# Altium footprint library XU-GENARAL PCB .PcbLib: 1176 footprints (part 36 of 75)
Each footprint in its own frame and in the unit in brackets; x right, y up, seen from the top. Pads: shape width x height; smd on the part's side, far side on the other; paste and mask are expansions set on the pad; w line width, h text height; cw(c..) or ccw(c..) is an arc to the next point about the centre after c.
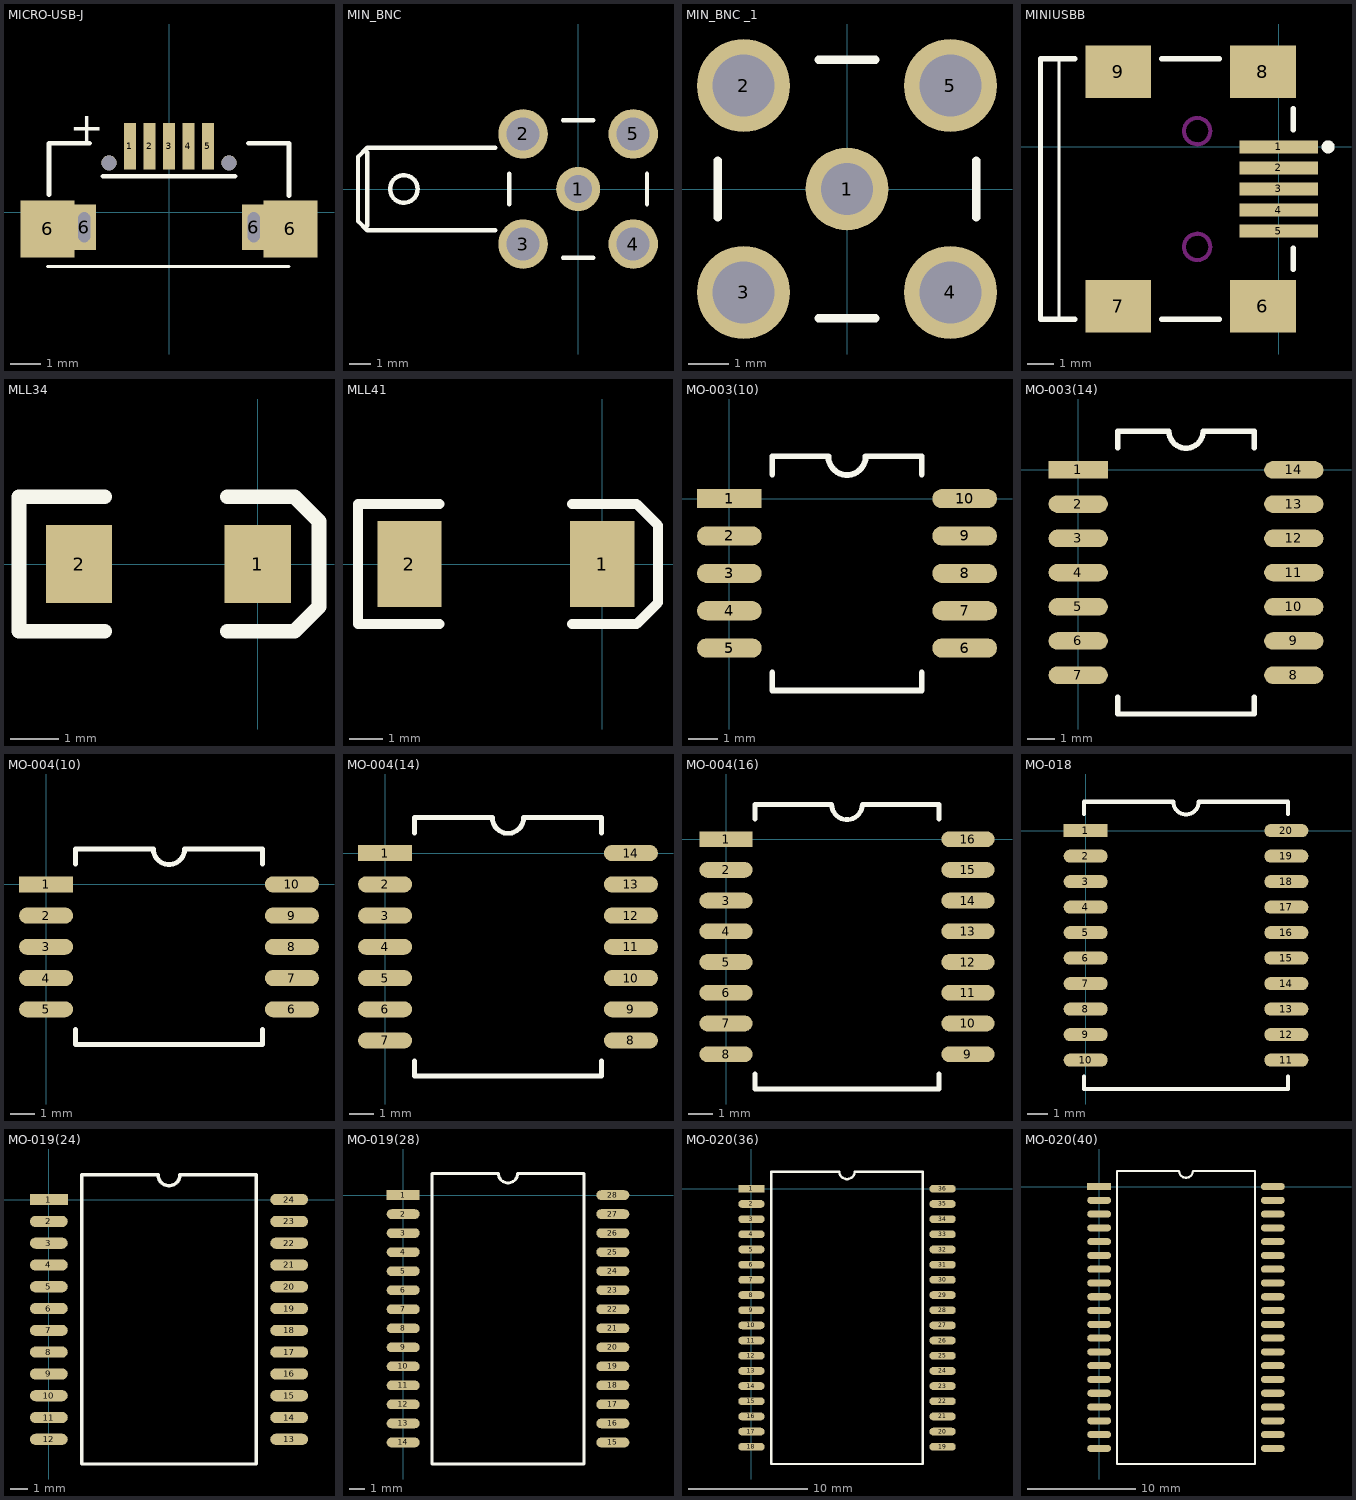
[diagram p35: the footprints below, top view; thin cyan lines are the x and y axes]

## MICRO-USB-J [mm]
pads (11):
  rect 0.4x1.55 smd: 1(-1.3,2.2) 2(-0.65,2.2) 3(0,2.2) 4(0.65,2.2) 5(1.3,2.2)
  rect 1.8x1.9 smd: 6(-4.05,-0.55) 6(4.05,-0.55)
  rect 0.8x1.5 hole 0.4 slot 1 at 90 deg: 6(-2.825,-0.5) 6(2.825,-0.5)
  round 0.5 hole 0.5 unplated: ""(-2,1.65) ""(2,1.65)
Top Overlay:
  lines w0.1: -4.05,-1.8 4,-1.8
  lines w0.152: -4,0.584 -4,2.3 -2.65,2.3 ; -2.2,1.2 2.2,1.2 ; 2.65,2.3 4,2.3 4,0.55
  text "+" at -3.3,2.35 h1
Keep-Out Layer:
  lines w0.127: -3.054,-1.043 -2.596,-1.043 -2.596,0.075 -3.054,0.075 -3.054,-1.043 ; 2.596,-1.043 3.054,-1.043 3.054,0.075 2.596,0.075 2.596,-1.043
Mechanical 1:
  lines w0.127: -3.054,-1.043 -3.054,0.075 -2.596,0.075 -2.596,-1.043 -3.054,-1.043 ; 2.596,-1.043 2.596,0.075 3.054,0.075 3.054,-1.043 2.596,-1.043

## MIN_BNC [mil]
height 43.31
pads (5):
  round 80 hole 50: 1(0,0)
  round 90 hole 60: 2(-100,100) 3(-100,-100) 4(100,-100) 5(100,100)
Top Overlay:
  circle w8: c-316.67,0 r25
  lines w8: -383.33,-66.67 -383.33,66.67 ; -150.63,-75 -383.33,-75 -400,-58.33 -400,58.33 -383.33,75 -150.63,75 ; -125,-27.56 -125,27.56 ; -27.56,-125 27.56,-125 ; -27.56,125 27.56,125 ; 125,-27.56 125,27.56

## MIN_BNC _1 [mil]
height 43.31
pads (5):
  round 80 hole 50: 1(0,0)
  round 90 hole 60: 2(-100,100) 3(-100,-100) 4(100,-100) 5(100,100)
Top Overlay:
  lines w8: -125,-27.56 -125,27.56 ; -27.56,-125 27.56,-125 ; -27.56,125 27.56,125 ; 125,-27.56 125,27.56

## MINIUSBB [mm]
pads (9):
  rect 3x0.5 smd: 1(0,0) 2(0,-0.8) 3(0,-1.6) 4(0,-2.4) 5(0,-3.2)
  rect 2.5x2 smd: 6(-0.6,-6.05) 7(-6.1,-6.05) 8(-0.6,2.85) 9(-6.1,2.85)
Top Overlay:
  circle w0.25: c1.875,0 r0.125
  lines w0.1: -8.35,-6.55 -8.35,3.35
  lines w0.2: -7.75,-6.55 -9.05,-6.55 -9.05,3.35 -7.75,3.35 ; -4.45,-6.55 -2.25,-6.55 ; -4.45,3.35 -2.25,3.35 ; 0.55,-4.65 0.55,-3.85 ; 0.55,0.65 0.55,1.45
Keep-Out Layer:
  circle w0.152: c-3.1,-3.8 r0.5
  circle w0.152: c-3.1,0.6 r0.5

## MLL34 [mil]
pads (2):
  rect 54x64 smd: 1(0,0) 2(-146,0)
Top Overlay:
  lines w12: -125,-55 -195,-55 -195,55 -125,55 ; -25,-55 30,-55 50,-35 50,35 30,55 -25,55

## MLL41 [mil]
pads (2):
  rect 75x100 smd: 1(0,0) 2(-225,0)
Top Overlay:
  lines w12: -190,-70 -285,-70 -285,70 -190,70 ; -35,-70 40,-70 65,-45 65,45 40,70 -35,70

## MO-003(10) [mm]
pads (10):
  rect 2.2x0.65 smd: 1(0,0)
  oval 2.2x0.65 smd: 2(0,-1.27) 3(0,-2.54) 4(0,-3.81) 5(0,-5.08) 6(8,-5.08) 7(8,-3.81) 8(8,-2.54) 9(8,-1.27) 10(8,0)
Top Overlay:
  lines w0.2: 1.46,-5.905 1.46,-6.52 6.54,-6.52 6.54,-5.905 ; 1.46,0.825 1.46,1.44 3.365,1.44 ccw(c4,1.44) 4.635,1.44 6.54,1.44 6.54,0.825

## MO-003(14) [mm]
pads (14):
  rect 2.2x0.65 smd: 1(0,0)
  oval 2.2x0.65 smd: 2(0,-1.27) 3(0,-2.54) 4(0,-3.81) 5(0,-5.08) 6(0,-6.35) 7(0,-7.62) 8(8,-7.62) 9(8,-6.35) 10(8,-5.08) 11(8,-3.81) 12(8,-2.54) 13(8,-1.27) 14(8,0)
Top Overlay:
  lines w0.2: 1.46,-8.445 1.46,-9.06 6.54,-9.06 6.54,-8.445 ; 1.46,0.825 1.46,1.44 3.365,1.44 ccw(c4,1.44) 4.635,1.44 6.54,1.44 6.54,0.825

## MO-004(10) [mm]
pads (10):
  rect 2.2x0.65 smd: 1(0,0)
  oval 2.2x0.65 smd: 2(0,-1.27) 3(0,-2.54) 4(0,-3.81) 5(0,-5.08) 6(10,-5.08) 7(10,-3.81) 8(10,-2.54) 9(10,-1.27) 10(10,0)
Top Overlay:
  lines w0.2: 1.19,-5.905 1.19,-6.52 8.81,-6.52 8.81,-5.905 ; 1.19,0.825 1.19,1.44 4.365,1.44 ccw(c5,1.44) 5.635,1.44 8.81,1.44 8.81,0.825

## MO-004(14) [mm]
pads (14):
  rect 2.2x0.65 smd: 1(0,0)
  oval 2.2x0.65 smd: 2(0,-1.27) 3(0,-2.54) 4(0,-3.81) 5(0,-5.08) 6(0,-6.35) 7(0,-7.62) 8(10,-7.62) 9(10,-6.35) 10(10,-5.08) 11(10,-3.81) 12(10,-2.54) 13(10,-1.27) 14(10,0)
Top Overlay:
  lines w0.2: 1.19,-8.445 1.19,-9.06 8.81,-9.06 8.81,-8.445 ; 1.19,0.825 1.19,1.44 4.365,1.44 ccw(c5,1.44) 5.635,1.44 8.81,1.44 8.81,0.825

## MO-004(16) [mm]
pads (16):
  rect 2.2x0.65 smd: 1(0,0)
  oval 2.2x0.65 smd: 2(0,-1.27) 3(0,-2.54) 4(0,-3.81) 5(0,-5.08) 6(0,-6.35) 7(0,-7.62) 8(0,-8.89) 9(10,-8.89) 10(10,-7.62) 11(10,-6.35) 12(10,-5.08) 13(10,-3.81) 14(10,-2.54) 15(10,-1.27) 16(10,0)
Top Overlay:
  lines w0.2: 1.19,-9.715 1.19,-10.33 8.81,-10.33 8.81,-9.715 ; 1.19,0.825 1.19,1.44 4.365,1.44 ccw(c5,1.44) 5.635,1.44 8.81,1.44 8.81,0.825

## MO-018 [mm]
pads (20):
  rect 2.2x0.65 smd: 1(0,0)
  oval 2.2x0.65 smd: 2(0,-1.27) 3(0,-2.54) 4(0,-3.81) 5(0,-5.08) 6(0,-6.35) 7(0,-7.62) 8(0,-8.89) 9(0,-10.16) 10(0,-11.43) 11(10,-11.43) 12(10,-10.16) 13(10,-8.89) 14(10,-7.62) 15(10,-6.35) 16(10,-5.08) 17(10,-3.81) 18(10,-2.54) 19(10,-1.27) 20(10,0)
Top Overlay:
  lines w0.2: -0.08,-12.255 -0.08,-12.87 10.08,-12.87 10.08,-12.255 ; -0.08,0.825 -0.08,1.44 4.365,1.44 ccw(c5,1.44) 5.635,1.44 10.08,1.44 10.08,0.825

## MO-019(24) [mm]
pads (24):
  rect 2.2x0.65 smd: 1(0,0)
  oval 2.2x0.65 smd: 2(0,-1.27) 3(0,-2.54) 4(0,-3.81) 5(0,-5.08) 6(0,-6.35) 7(0,-7.62) 8(0,-8.89) 9(0,-10.16) 10(0,-11.43) 11(0,-12.7) 12(0,-13.97) 13(14,-13.97) 14(14,-12.7) 15(14,-11.43) 16(14,-10.16) 17(14,-8.89) 18(14,-7.62) 19(14,-6.35) 20(14,-5.08) 21(14,-3.81) 22(14,-2.54) 23(14,-1.27) 24(14,0)
Top Overlay:
  lines w0.2: 1.92,-15.41 12.08,-15.41 12.08,-6.985 12.08,1.44 7.635,1.44 cw(c7,1.44) 6.365,1.44 1.92,1.44 1.92,-6.985 1.92,-15.41

## MO-019(28) [mm]
pads (28):
  rect 2.2x0.65 smd: 1(0,0)
  oval 2.2x0.65 smd: 2(0,-1.27) 3(0,-2.54) 4(0,-3.81) 5(0,-5.08) 6(0,-6.35) 7(0,-7.62) 8(0,-8.89) 9(0,-10.16) 10(0,-11.43) 11(0,-12.7) 12(0,-13.97) 13(0,-15.24) 14(0,-16.51) 15(14,-16.51) 16(14,-15.24) 17(14,-13.97) 18(14,-12.7) 19(14,-11.43) 20(14,-10.16) 21(14,-8.89) 22(14,-7.62) 23(14,-6.35) 24(14,-5.08) 25(14,-3.81) 26(14,-2.54) 27(14,-1.27) 28(14,0)
Top Overlay:
  lines w0.2: 1.92,-17.95 12.08,-17.95 12.08,-8.255 12.08,1.44 7.635,1.44 cw(c7,1.44) 6.365,1.44 1.92,1.44 1.92,-8.255 1.92,-17.95

## MO-020(36) [mm]
pads (36):
  rect 2.2x0.65 smd: 1(0,0)
  oval 2.2x0.65 smd: 2(0,-1.27) 3(0,-2.54) 4(0,-3.81) 5(0,-5.08) 6(0,-6.35) 7(0,-7.62) 8(0,-8.89) 9(0,-10.16) 10(0,-11.43) 11(0,-12.7) 12(0,-13.97) 13(0,-15.24) 14(0,-16.51) 15(0,-17.78) 16(0,-19.05) 17(0,-20.32) 18(0,-21.59) 19(16,-21.59) 20(16,-20.32) 21(16,-19.05) 22(16,-17.78) 23(16,-16.51) 24(16,-15.24) 25(16,-13.97) 26(16,-12.7) 27(16,-11.43) 28(16,-10.16) 29(16,-8.89) 30(16,-7.62) 31(16,-6.35) 32(16,-5.08) 33(16,-3.81) 34(16,-2.54) 35(16,-1.27) 36(16,0)
Top Overlay:
  lines w0.2: 1.65,-23.03 14.35,-23.03 14.35,-10.795 14.35,1.44 8.635,1.44 cw(c8,1.44) 7.365,1.44 1.65,1.44 1.65,-10.795 1.65,-23.03

## MO-020(40) [mm]
pads (40):
  rect 2.2x0.65 smd: 1(0,0)
  oval 2.2x0.65 smd: 2(0,-1.27) 3(0,-2.54) 4(0,-3.81) 5(0,-5.08) 6(0,-6.35) 7(0,-7.62) 8(0,-8.89) 9(0,-10.16) 10(0,-11.43) 11(0,-12.7) 12(0,-13.97) 13(0,-15.24) 14(0,-16.51) 15(0,-17.78) 16(0,-19.05) 17(0,-20.32) 18(0,-21.59) 19(0,-22.86) 20(0,-24.13) 21(16,-24.13) 22(16,-22.86) 23(16,-21.59) 24(16,-20.32) 25(16,-19.05) 26(16,-17.78) 27(16,-16.51) 28(16,-15.24) 29(16,-13.97) 30(16,-12.7) 31(16,-11.43) 32(16,-10.16) 33(16,-8.89) 34(16,-7.62) 35(16,-6.35) 36(16,-5.08) 37(16,-3.81) 38(16,-2.54) 39(16,-1.27) 40(16,0)
Top Overlay:
  lines w0.2: 1.65,-25.57 14.35,-25.57 14.35,-12.065 14.35,1.44 8.635,1.44 cw(c8,1.44) 7.365,1.44 1.65,1.44 1.65,-12.065 1.65,-25.57